# Altium footprint library Elettronica FM.PcbLib: 387 footprints (part 9 of 25)
Each footprint in its own frame and in the unit in brackets; x right, y up, seen from the top. Pads: shape width x height; smd on the part's side, far side on the other; paste and mask are expansions set on the pad; w line width, h text height; cw(c..) or ccw(c..) is an arc to the next point about the centre after c.
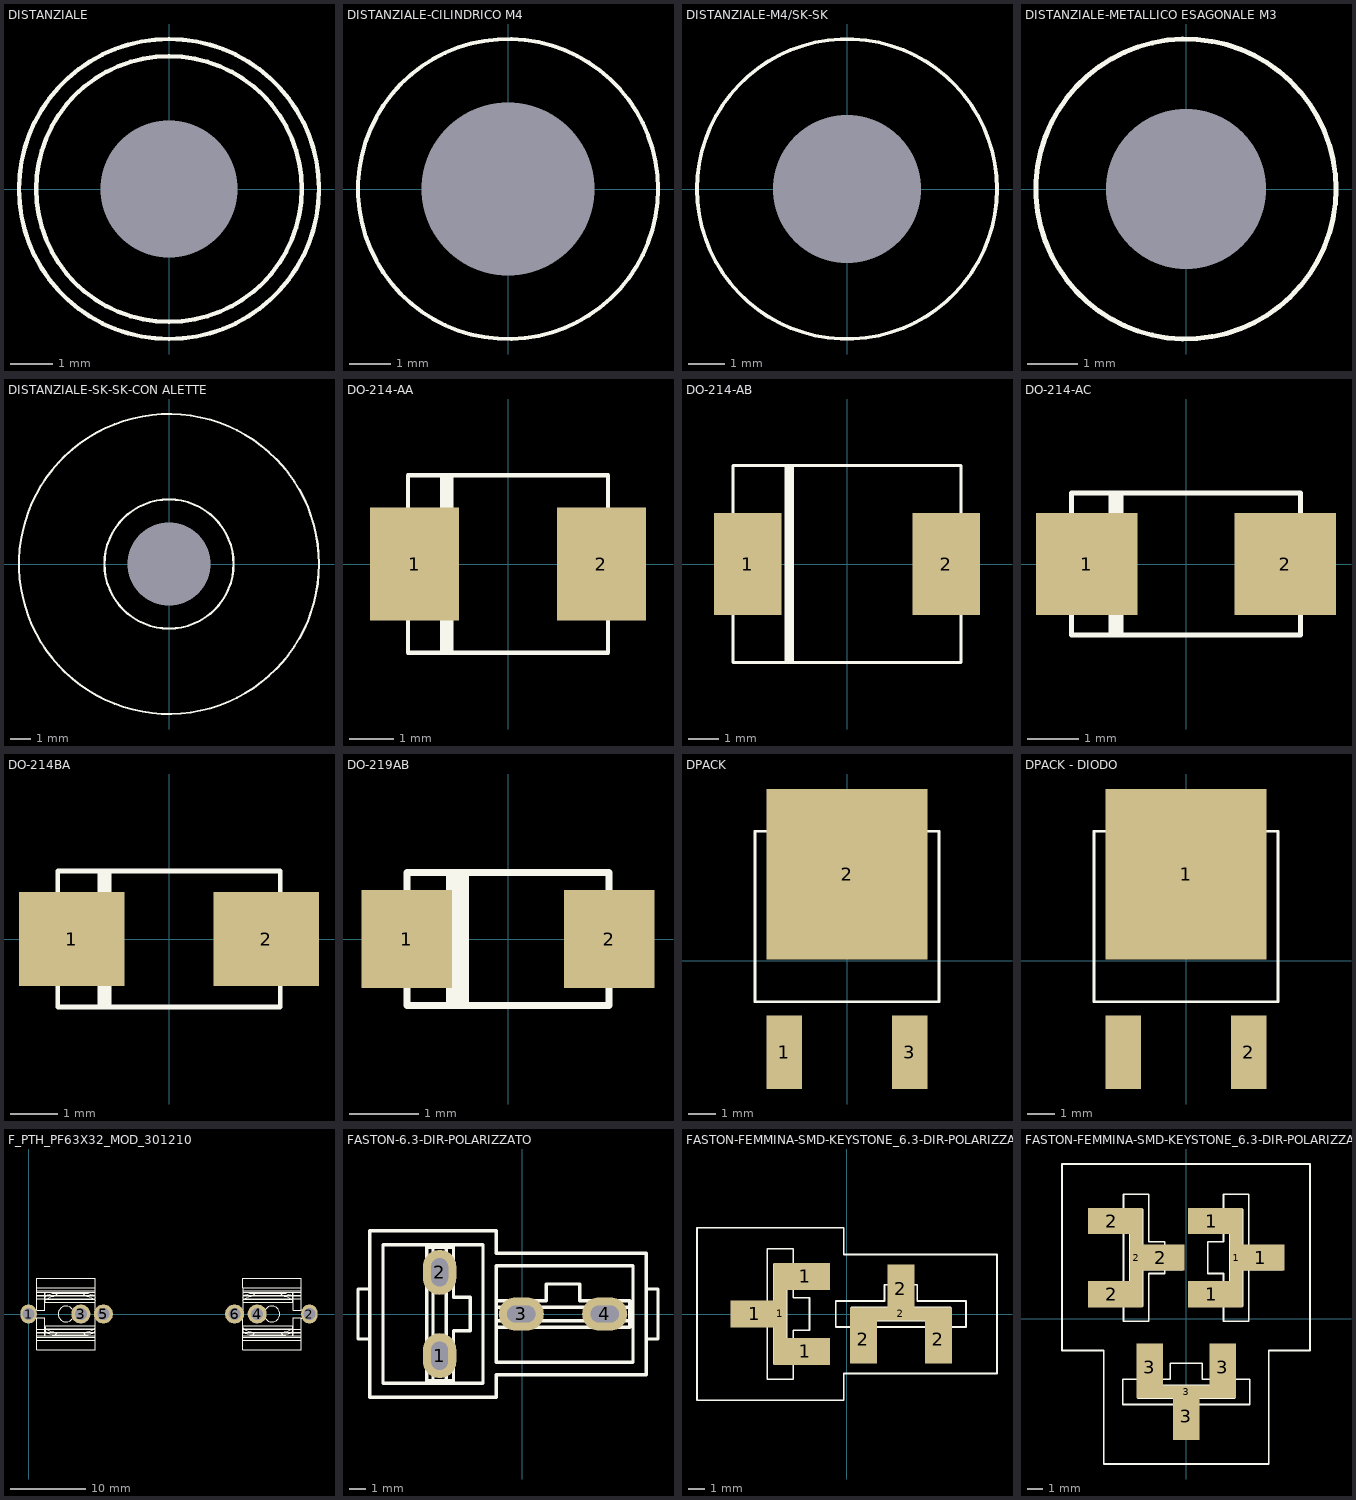
[diagram p8: the footprints below, top view; thin cyan lines are the x and y axes]

## DISTANZIALE [mm]
pads (1):
  round 0 hole 3.2 unplated mask-5: 0(0,0)
Top Overlay:
  circle w0.1: c0,0 r3.1
  circle w0.1: c0,0 r3.5
Bottom Overlay:
  circle w0.1: c0,0 r3.1
  circle w0.1: c0,0 r3.5

## DISTANZIALE-CILINDRICO M4 [mm]
pads (1):
  round 0 hole 4.2 unplated mask-5: 0(0,0)
Top Overlay:
  circle w0.1: c0,0 r3.65
Bottom Overlay:
  circle w0.1: c0,0 r3.65
3D body: height 20, standoff 0, extent -3.5,-3.497 3.5,3.497
3D body: height 0, standoff -8, extent -2,-2 2,2
3D body: height 24.4, standoff 22, extent -3.5,-3.497 3.5,3.497

## DISTANZIALE-M4/SK-SK [mm]
pads (1):
  round 0 hole 4.1 unplated mask-5: 0(0,0)
Top Overlay:
  circle w0.1: c0,0 r4.15
Bottom Overlay:
  circle w0.1: c0,0 r4.15
3D body: height 25, standoff 0, extent -4.05,-4.046 4.05,4.047
3D body: height 0, standoff -8, extent -2,-2 2,2
3D body: height 30.5, standoff 27, extent -4,-3.997 4,3.997

## DISTANZIALE-METALLICO ESAGONALE M3 [mm]
pads (1):
  round 0 hole 3.2 unplated mask-5: 0(0,0)
Top Overlay:
  circle w0.1: c0,0 r3
Bottom Overlay:
  circle w0.1: c0,0 r3
3D body: height 20, standoff 0, extent -2.9,-2.897 2.9,2.897
3D body: height 0, standoff -8, extent -1.488,-1.497 1.5,1.497
3D body: height 24.4, standoff 22, extent -2.9,-2.897 2.9,2.897

## DISTANZIALE-SK-SK-CON ALETTE [mm]
pads (1):
  round 0 hole 4 unplated mask-5: 0(0,0)
Top Overlay:
  circle w0.1: c0,0 r7.2
  circle w0.1: c0,0 r3.1
Bottom Overlay:
  circle w0.1: c0,0 r3.5
  circle w0.1: c0,0 r3.1

## DO-214-AA [mm]
height 1.9
pads (2):
  rect 2x2.55 smd paste-0.05: 1(-2.1,0) 2(2.1,0)
Top Overlay:
  lines w0.1: -2.25,-1.1 -2.8,-1.1 -2.8,1.1 -2.25,1.1 ; -1.475,-2 -1.475,2 ; -1.375,-2 -1.375,2 ; -1.275,-2 -1.275,2 ; 2.25,-1.1 2.8,-1.1 2.8,1.1 2.25,1.1 ; -2.25,-2 2.25,-2 2.25,2 -2.25,2 -2.25,-2
3D body: height 2.3, standoff 0, extent -2.25,-2 2.25,2

## DO-214-AB [mm]
pads (2):
  rect 2.2x3.3 smd mask+0.1: 1(-3.225,0) 2(3.225,0)
Top Overlay:
  lines w0.1: -1.975,-3.2 -1.975,3.2 ; -1.875,-3.2 -1.875,3.2 ; -1.775,-3.2 -1.775,3.2 ; -3.7,-3.2 -3.7,3.2 3.7,3.2 3.7,-3.2 -3.7,-3.2
3D body "DO-214-AB.stp": height 2.61, standoff 0, extent -4.05,-3.1 4.05,3.1

## DO-214-AC [mm]
height 1.9
pads (2):
  rect 2x2 smd paste-0.05: 1(-1.95,0) 2(1.95,0)
Top Overlay:
  lines w0.1: -2.25,-0.825 -2.65,-0.825 -2.65,0.825 -2.25,0.825 ; -1.475,-1.4 -1.475,1.4 ; -1.375,-1.4 -1.375,1.4 ; -1.275,-1.4 -1.275,1.4 ; 2.25,-0.825 2.65,-0.825 2.65,0.825 2.25,0.825 ; -2.25,-1.4 -2.25,1.4 2.25,1.4 2.25,-1.4 -2.25,-1.4
3D body: height 2.3, standoff 0, extent -2.25,-1.4 2.25,1.4

## DO-214BA [mm]
height 1.9
pads (2):
  rect 2.25x2 smd paste-0.05: 1(-2.075,0) 2(2.075,0)
Top Overlay:
  lines w0.1: -2.375,-0.85 -2.875,-0.85 -2.875,0.85 -2.375,0.85 ; -1.475,-1.4 -1.475,1.4 ; -1.375,-1.4 -1.375,1.4 ; -1.275,-1.4 -1.275,1.4 ; 2.375,-0.85 2.875,-0.85 2.875,0.85 2.375,0.85 ; -2.375,-1.45 2.375,-1.45 2.375,1.45 -2.375,1.45 -2.375,-1.45
3D body: height 3, standoff 0, extent -2.375,-1.45 2.375,1.45

## DO-219AB [mm]
pads (2):
  rect 1.3x1.4 smd: 1(-1.45,0) 2(1.45,0)
Top Overlay:
  lines w0.1: -1.45,-0.95 -1.45,0.95 1.45,0.95 1.45,-0.95 -1.45,-0.95
  lines w0.178: -0.8,-0.9 -0.8,0.9 ; -0.65,-0.9 -0.65,0.9
3D body: height 1.1, standoff 0, extent -1.45,-0.95 1.45,0.95

## DPACK [mm]
pads (3):
  rect 1.3x2.7 smd: 1(-2.3,-3.35) 3(2.3,-3.35)
  rect 5.9x6.25 smd: 2(0,3.175)
Top Overlay:
  lines w0.1: -2.75,4.75 -2.75,6 2.75,6 2.75,4.75 ; -3.375,-1.5 -3.375,4.75 3.375,4.75 3.375,-1.5 -3.375,-1.5
3D body: height 2.35, standoff 0, extent -3.375,-1.5 3.375,4.75
3D body: height 0.6, standoff 0, extent -2.75,4.75 2.75,6
3D body: height 1.2, standoff 0, extent -2.75,-4.5 -1.85,-1.5
3D body: height 1.2, standoff 0, extent 1.85,-4.5 2.75,-1.4

## DPACK - DIODO [mm]
pads (3):
  rect 5.9x6.25 smd: 1(0,3.175)
  rect 1.3x2.7 smd: 2(2.3,-3.35) ""(-2.3,-3.35)
Top Overlay:
  lines w0.1: -2.75,4.75 -2.75,6 2.75,6 2.75,4.75 ; -3.375,-1.5 -3.375,4.75 3.375,4.75 3.375,-1.5 -3.375,-1.5
3D body: height 2.35, standoff 0, extent -3.375,-1.5 3.375,4.75
3D body: height 0.6, standoff 0, extent -2.75,4.75 2.75,6
3D body: height 1.2, standoff 0, extent -2.75,-4.5 -1.85,-1.5
3D body: height 1.2, standoff 0, extent 1.85,-4.5 2.75,-1.4

## F_PTH_PF63X32_MOD_301210 [mm]
pads (6):
  oval 2.2x2.54 hole 1.6: 1(0,0) 2(37.5,0)
  round 2.54 hole 1.6: 3(6.985,0) 4(30.515,0) 6(27.5,0)
  round 2.54 / inner round 0 / far side round 2.54 hole 1.6: 5(10,0)
Top Overlay:
  drawing of 250 lines, arcs and shapes, not listed
3D body: height 10.24, standoff 3.76, extent 2.725,-3.3 34.725,3.174
3D body "751-0056.stp": height 11.13, standoff -4, extent -0.15,-3.45 10.25,3.55
3D body "751-0056.stp": height 11.13, standoff -4, extent 27.25,-3.55 37.65,3.45

## FASTON-6.3-DIR-POLARIZZATO [mm]
height 40.5
pads (4):
  oval 2x2.7 hole 1 slot 1.7 at 90 deg: 1(-4.95,-2.5) 2(-4.95,2.5)
  oval 2.7x2 hole 1 slot 1.7 at 0 deg: 3(-0.05,0) 4(4.95,0)
Top Overlay:
  lines w0.2: -9.15,-1.5 -9.85,-1.5 -9.85,1.5 -9.15,1.5 ; 7.45,-1.5 8.15,-1.5 8.15,1.5 7.45,1.5 ; -4.125,1 -4.125,4 -5.725,4 -5.725,-4 -4.125,-4 -4.125,-1 -3.125,-1 -3.125,1 -4.125,1 ; -4.125,1 -4.125,1 ; -9.15,-5 -1.55,-5 -1.55,-3.65 7.45,-3.65 7.45,3.65 -1.55,3.65 -1.55,5 -9.15,5 -9.15,-5 ; -8.35,-4.15 -8.35,4.15 -2.35,4.15 -2.35,-4.15 -8.35,-4.15 ; -5.35,-4 -5.35,4 -4.55,4 -4.55,-4 -5.35,-4 ; -5.35,-3.2 -5.35,-1.8 -4.55,-1.8 -4.55,-3.2 -5.35,-3.2 ; -5.35,1.8 -4.55,1.8 -4.55,3.2 -5.35,3.2 -5.35,1.8 ; -1.55,-2.9 6.65,-2.9 6.65,2.9 -1.55,2.9 -1.55,-2.9 ; -1.55,-0.8 -1.55,0.8 1.45,0.8 1.45,1.8 3.45,1.8 3.45,0.8 6.45,0.8 6.45,-0.8 -1.55,-0.8 ; -1.55,-0.4 -1.55,0.4 6.45,0.4 6.45,-0.4 -1.55,-0.4 ; -0.75,-0.4 0.65,-0.4 0.65,0.4 -0.75,0.4 -0.75,-0.4 ; 4.25,-0.4 4.25,0.4 5.65,0.4 5.65,-0.4 4.25,-0.4
3D body: height 0, standoff -3.1, extent 4.25,-0.4 5.65,0.4
3D body: height 8, standoff 0, extent -0.75,-0.4 5.65,0.4
3D body: height 0, standoff -3.1, extent -0.75,-0.4 0.65,0.4
3D body: height 2, standoff 0, extent -1.55,-0.4 6.45,0.4
3D body: height 2, standoff 0, extent -5.35,-4 -4.55,4
3D body: height 0, standoff -3.1, extent -5.35,1.8 -4.55,3.2
3D body: height 8, standoff 0, extent -5.35,-3.2 -4.55,3.2
3D body: height 0, standoff -3.1, extent -5.35,-3.2 -4.55,-1.8
3D body: height 1, standoff 0, extent -9.15,-5 7.45,5
3D body: height 9.8, standoff 0, extent 7.45,-1.5 8.15,1.5
3D body: height 9.8, standoff 0, extent -9.85,-1.5 -9.15,1.5
3D body: height 23, standoff 0, extent -9.15,-5 7.45,5

## FASTON-FEMMINA-SMD-KEYSTONE_6.3-DIR-POLARIZZATO-2POLI [mm]
height 40.5
pads (10):
  round 0.1 on Top Overlay mask+0.1: 0(3.325,0) 1(-4.075,0)
  rect 3x1.65 smd paste-5 mask+0.1: 1(-5.625,0) 1(-2.525,-2.3) 1(-2.525,2.3)
  rect 0.8x6.25 smd paste-5 mask-5: 1(-4.075,0)
  rect 1.65x3 smd paste-5 mask+0.1: 2(1.025,-1.55) 2(3.325,1.55) 2(5.625,-1.55)
  rect 6.25x0.8 smd paste-5 mask-5: 2(3.325,0)
Top Overlay:
  lines w0.1: -4.475,-0.75 -7,-0.75 -7,0.75 -4.475,0.75 ; -3.675,-1.55 -1.15,-1.55 -1.15,-3.05 -3.675,-3.05 ; -3.675,1.55 -1.15,1.55 -1.15,3.05 -3.675,3.05 ; 1.775,-0.4 1.775,-2.925 0.275,-2.925 0.275,-0.4 ; 2.575,0.4 2.575,2.925 4.075,2.925 4.075,0.4 ; 4.325,0.8 4.325,1.8 ; 4.325,0.8 7.325,0.8 7.325,-0.8 -0.675,-0.8 -0.675,0.8 2.325,0.8 2.325,1.8 4.325,1.8 ; 4.875,-0.4 4.875,-2.925 6.375,-2.925 6.375,-0.4 ; -3.675,-3.05 -3.675,3.05 ; -3.675,-3.05 -4.475,-3.05 -4.475,3.05 -3.675,3.05 ; 0.275,-0.4 0.275,0.4 6.375,0.4 6.375,-0.4 ; 0.275,-0.4 6.375,-0.4 ; -9.175,-5.3 -0.175,-5.3 -0.175,-3.65 9.225,-3.65 9.225,3.65 -0.175,3.65 -0.175,5.3 -9.175,5.3 -9.175,-5.3 ; -4.875,-4 -4.875,4 -3.275,4 -3.275,1 -2.275,1 -2.275,-1 -3.275,-1 -3.275,-4 -4.875,-4
3D body "keystone-PN4928.STEP": height 10.5, standoff 0.01, extent -7,-3.046 -1.158,3.05
3D body "keystone-PN4928.STEP": height 10.5, standoff 0.01, extent 0.279,-2.917 6.375,2.925
3D body "c-180907-aa-3d.stp": height 24.4, standoff 1.48, extent -8.975,-5.1 9.025,5.1

## FASTON-FEMMINA-SMD-KEYSTONE_6.3-DIR-POLARIZZATO-3POLI [mm]
height 40.5
pads (15):
  round 0.1 on Top Overlay mask+0.1: 0(3.15,3.85) 1(-3.15,3.85) 1(0,-4.6)
  rect 3x1.65 smd paste-5 mask+0.1: 1(1.6,1.55) 1(1.6,6.15) 1(4.7,3.85) 2(-4.7,1.55) 2(-4.7,6.15) 2(-1.6,3.85)
  rect 0.8x6.25 smd paste-5 mask-5: 1(3.15,3.85) 2(-3.15,3.85)
  rect 1.65x3 smd paste-5 mask+0.1: 3(-2.3,-3.05) 3(0,-6.15) 3(2.3,-3.05)
  rect 6.25x0.8 smd paste-5 mask-5: 3(0,-4.6)
Top Overlay:
  lines w0.1: -3.55,2.3 -6.075,2.3 -6.075,0.8 -3.55,0.8 ; -3.55,5.4 -6.075,5.4 -6.075,6.9 -3.55,6.9 ; -2.75,3.1 -0.225,3.1 -0.225,4.6 -2.75,4.6 ; -1.55,-4.2 -1.55,-1.675 -3.05,-1.675 -3.05,-4.2 ; -0.75,-5 -0.75,-7.525 0.75,-7.525 0.75,-5 ; 1.55,-4.2 1.55,-1.675 3.05,-1.675 3.05,-4.2 ; 2.35,2.85 1.35,2.85 1.35,4.85 2.35,4.85 ; 2.35,2.85 2.35,-0.15 3.95,-0.15 3.95,7.85 2.35,7.85 2.35,4.85 ; 2.75,2.3 0.225,2.3 0.225,0.8 2.75,0.8 ; 2.75,5.4 0.225,5.4 0.225,6.9 2.75,6.9 ; 3.55,3.1 6.075,3.1 6.075,4.6 3.55,4.6 ; -3.55,0.8 -3.55,6.9 ; -3.55,0.8 -2.75,0.8 -2.75,6.9 -3.55,6.9 ; -3.05,-4.2 -3.05,-5 3.05,-5 3.05,-4.2 ; -3.05,-4.2 3.05,-4.2 ; 2.75,0.8 3.55,0.8 3.55,6.9 2.75,6.9 ; 2.75,0.8 2.75,6.9 ; -7.825,-2 -5.2,-2 -5.2,-9.15 5.2,-9.15 5.2,-2 7.8,-2 7.8,9.75 -7.825,9.75 -7.825,-2 ; -4,-5.4 4,-5.4 4,-3.8 1,-3.8 1,-2.8 -1,-2.8 -1,-3.8 -4,-3.8 -4,-5.4 ; -3.95,-0.15 -2.35,-0.15 -2.35,2.85 -1.35,2.85 -1.35,4.85 -2.35,4.85 -2.35,7.85 -3.95,7.85 -3.95,-0.15
3D body "c-180941-p5-3d.stp": height 24.3, standoff 1.5, extent -7.6,-8.95 7.6,9.55
3D body "keystone-PN4928.STEP": height 10.5, standoff 0.01, extent -3.05,-7.525 3.046,-1.683
3D body "keystone-PN4928.STEP": height 10.5, standoff 0.01, extent -6.067,0.8 -0.225,6.896
3D body "keystone-PN4928.STEP": height 10.5, standoff 0.01, extent 0.233,0.8 6.075,6.896